# Altium footprint library others.PcbLib: 50 footprints (part 3 of 4)
Each footprint in its own frame and in the unit in brackets; x right, y up, seen from the top. Pads: shape width x height; smd on the part's side, far side on the other; paste and mask are expansions set on the pad; w line width, h text height; cw(c..) or ccw(c..) is an arc to the next point about the centre after c.
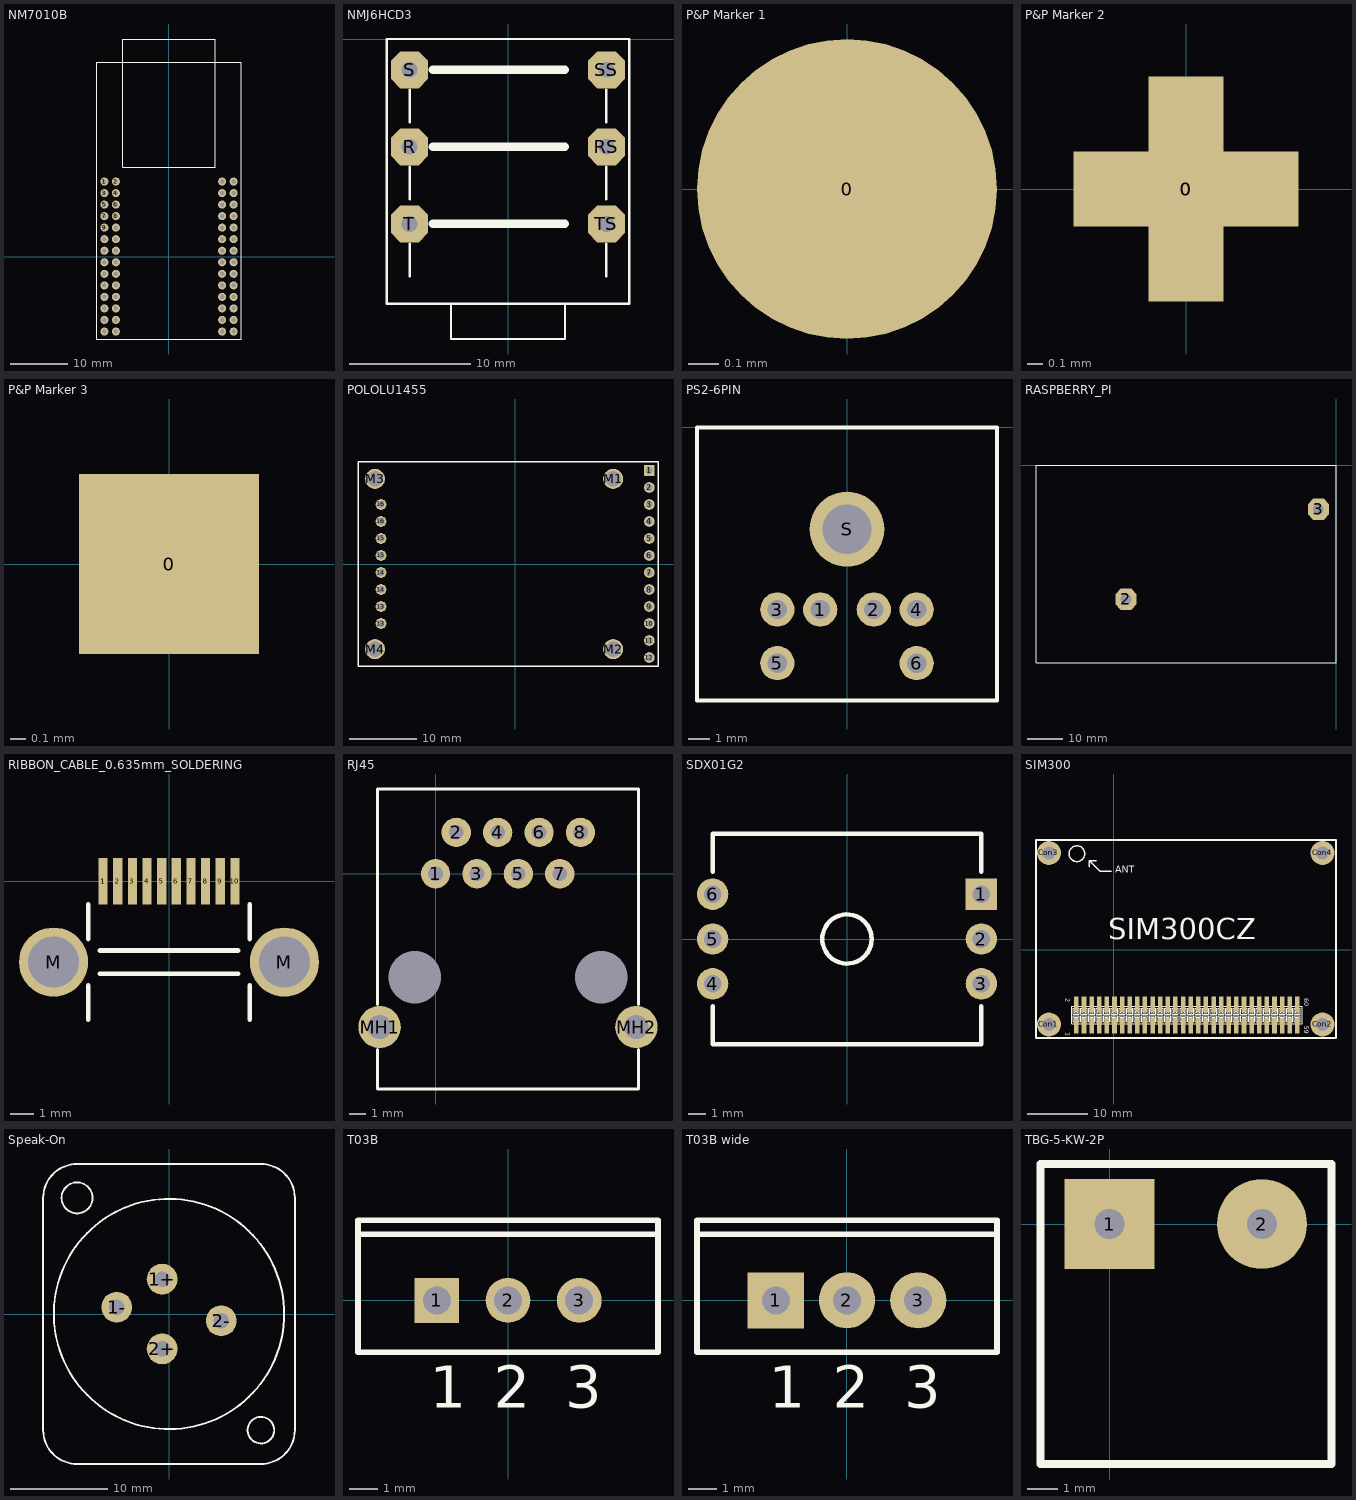
[diagram p2: the footprints below, top view; thin cyan lines are the x and y axes]

## NM7010B [mm]
pads (56):
  round 1.4 hole 0.8: 1(-11.2,13) 2(-9.2,13) 3(-11.2,11) 4(-9.2,11) 5(-11.2,9) 6(-9.2,9) 7(-11.2,7) 8(-9.2,7) 9(-11.2,5) 10(-9.2,5) 11(-11.2,3) 12(-9.2,3) 13(-11.2,1) 14(-9.2,1) 15(-11.2,-1) 16(-9.2,-1) 17(-11.2,-3) 18(-9.2,-3) 19(-11.2,-5) 20(-9.2,-5) 21(-11.2,-7) 22(-9.2,-7) 23(-11.2,-9) 24(-9.2,-9) 25(-11.2,-11) 26(-9.2,-11) 27(-11.2,-13) 28(-9.2,-13) 29(9.2,13) 30(11.2,13) 31(9.2,11) 32(11.2,11) 33(9.2,9) 34(11.2,9) 35(9.2,7) 36(11.2,7) 37(9.2,5) 38(11.2,5) 39(9.2,3) 40(11.2,3) 41(9.2,1) 42(11.2,1) 43(9.2,-1) 44(11.2,-1) 45(9.2,-3) 46(11.2,-3) 47(9.2,-5) 48(11.2,-5) 49(9.2,-7) 50(11.2,-7) 51(9.2,-9) 52(11.2,-9) 53(9.2,-11) 54(11.2,-11) 55(9.2,-13) 56(11.2,-13)
Top Overlay:
  lines w0.2: -12.5,-14.3 -12.5,33.7 12.5,33.7 12.5,-14.3 -12.5,-14.3 ; -8,15.5 8,15.5 8,37.7 -8,37.7 -8,15.5

## NMJ6HCD3 [mm]
pads (6):
  oct 3.048x3.048 hole 1.3: R(-8.115,-8.89) RS(8.115,-8.89) S(-8.115,-2.54) SS(8.115,-2.54) T(-8.115,-15.24) TS(8.115,-15.24)
Top Overlay:
  lines w0.2: -8.115,-19.558 -8.115,-16.891 ; -8.115,-13.208 -8.115,-10.541 ; -8.115,-6.858 -8.115,-4.191 ; -4.7,-21.81 -4.7,-24.73 4.7,-24.73 4.7,-21.81 ; 8.115,-19.558 8.115,-16.891 ; 8.115,-13.208 8.115,-10.541 ; 8.115,-6.858 8.115,-4.191 ; -10,-21.81 10,-21.81 10,0 -10,0 -10,-21.81
  lines w0.7: -6.223,-15.24 4.699,-15.24 ; -6.223,-8.89 4.699,-8.89 ; -6.223,-2.54 4.699,-2.54

## P&P Marker 1 [mm] "SMD Pick&Place Machine Marker"
pads (1):
  round 1 smd paste-1 mask+0.508: 0(0,0)

## P&P Marker 2 [mm] "SMD Pick&Place Machine Marker"
pads (2):
  rect 0.5x1.5 smd paste-1 mask+0.1: 0(0,0)
  rect 1.5x0.5 smd paste-1 mask+0.1: 0(0,0)
Top Solder:
  rectangle: -1,-1 1,1

## P&P Marker 3 [mm] "SMD Pick&Place Machine Marker"
pads (1):
  rect 1.2x1.2 smd paste-1 mask+0.1: 0(0,0)
Top Solder:
  rectangle: -1,-1 1,1

## POLOLU1455 [mm] "Pololu 18v25 CS High-Power Motor Driver"
pads (24):
  rect 1.6x1.6 hole 1: 1(20,13.97)
  round 1.6 hole 1: 2(20,11.43) 3(20,8.89) 4(20,6.35) 5(20,3.81) 6(20,1.27) 7(20,-1.27) 8(20,-3.81) 9(20,-6.35) 10(20,-8.89) 11(20,-11.43) 12(20,-13.97) 13(-20.066,-8.89) 13(-20.066,-6.35) 14(-20.066,-3.81) 14(-20.066,-1.27) 15(-20.066,1.27) 15(-20.066,3.81) 16(-20.066,6.35) 16(-20.066,8.89)
  round 3 hole 2.3: M1(14.605,12.7) M2(14.605,-12.7) M3(-20.955,12.7) M4(-20.955,-12.7)
Top Overlay:
  lines w0.2: -23.495,-15.24 21.3,-15.24 21.3,15.24 -23.495,15.24 -23.495,-15.24
3D body: height -12.5, standoff -13.05, extent -23.495,-15.25 21.3,15.23
3D body "Samtec-TSW-112-23-F-S.STEP": height 13.97, standoff 2.67, extent 18.73,-15.25 21.27,15.23
3D body "Samtec-SSW-108-01-G-S.step": height 8.51, standoff -2.64, extent -21.272,-10.541 -18.859,10.287
3D body "Samtec-TSW-108-23-F-S.STEP": height 13.97, standoff 2.67, extent -21.336,-10.287 -18.796,10.033
3D body: height 12.7, standoff 11.05, extent -23.495,-15.24 21.3,15.24
3D body "screwcl_m2x16.stp": height 14, standoff -3.3, extent -22.955,-14.7 -18.955,-10.7
3D body "screwcl_m2x16.stp": height 14, standoff -3.3, extent -22.955,10.7 -18.955,14.7
3D body "screwcl_m2x16.stp": height 14, standoff -3.3, extent 12.605,10.7 16.605,14.7
3D body "screwcl_m2x16.stp": height 14, standoff -3.3, extent 12.605,-14.7 16.605,-10.7
3D body "User Library-Capacitor electrolytic axial 1in pitch.STEP": height 13.5, standoff 2.49, extent 6.287,-13.174 14.287,13.123
3D body "User Library-Capacitor electrolytic axial 1in pitch.STEP": height 13.5, standoff 2.49, extent -3.238,-13.208 4.762,13.089
3D body "Samtec-SSW-112-01-G-S.step": height 8.51, standoff -2.64, extent 18.793,-15.524 21.207,15.464

## PS2-6PIN [mm]
pads (7):
  round 1.6 hole 0.9: 1(-1.25,-8.5) 2(1.25,-8.5) 3(-3.25,-8.5) 4(3.25,-8.5) 5(-3.25,-11) 6(3.25,-11)
  round 3.5 hole 2.3: S(0,-4.75)
Top Overlay:
  lines w0.2: -7,-12.75 7,-12.75 7,0 -7,0 -7,-12.75

## RASPBERRY_PI [mm]
pads (2):
  oct 6x6 hole 3: 2(-59.5,-38) 3(-5,-12.5)
Top Overlay:
  lines w0.2: -85,-56 -85,0 0,0 0,-56 -85,-56
3D body "User Library-R-pi.STEP": height 36.73, standoff 15.83, extent -95.55,-57.1 8.55,7.5

## RIBBON_CABLE_0.635mm_SOLDERING [mm]
pads (13):
  rect 0.4x2 smd: 1(-2.857,0) 1(-2.857,0) 2(-2.222,0) 3(-1.587,0) 4(-0.953,0) 5(-0.318,0) 6(0.318,0) 7(0.953,0) 8(1.587,0) 9(2.222,0) 10(2.857,0)
  round 3 hole 2.2: M(-5,-3.5) M(5,-3.5)
Top Overlay:
  lines w0.2: -3.5,-6 -3.5,-4.5 ; -3.5,-2.5 -3.5,-1 ; -3,-4 3,-4 ; -3,-3 3,-3 ; 3.5,-6 3.5,-4.5 ; 3.5,-2.5 3.5,-1

## RJ45 [mm]
height 12.7
pads (12):
  round 1.8 hole 0.9: 1(0,0) 2(1.27,2.54) 3(2.54,0) 4(3.81,2.54) 5(5.08,0) 6(6.35,2.54) 7(7.62,0) 8(8.89,2.54)
  round 2.6 hole 1.5: MH1(-3.429,-9.398) MH2(12.319,-9.398)
  round 0 hole 3.2: MH3(-1.27,-6.35) MH4(10.16,-6.35)
Top Overlay:
  lines w0.2: -3.555,-10.8 -3.555,-13.2 12.445,-13.2 12.445,-10.8 ; -3.555,-8 -3.555,5.2 12.445,5.2 12.445,-8

## SDX01G2 [mil]
pads (6):
  rect 70x70 hole 39.37: 1(300,100)
  round 70 hole 39.37: 2(300,0) 3(300,-100) 4(-300,-100) 5(-300,0) 6(-300,100)
Top Overlay:
  circle w10: c0,0 r55
  lines w10: -300,-150 -300,-235 300,-235 300,-150 ; -300,150 -300,235 300,235 300,150

## SIM300 [mm]
height 1.092
pads (64):
  rect 0.76x2.54 smd: 1(-6.223,-12.66) 2(-6.223,-9.1) 3(-4.953,-12.66) 4(-4.953,-9.1) 5(-3.683,-12.66) 6(-3.683,-9.1) 7(-2.413,-12.66) 8(-2.413,-9.1) 9(-1.143,-12.66) 10(-1.143,-9.1) 11(0.127,-12.66) 12(0.127,-9.1) 13(1.397,-12.66) 14(1.397,-9.1) 15(2.667,-12.66) 16(2.667,-9.1) 17(3.937,-12.66) 18(3.937,-9.1) 19(5.207,-12.66) 20(5.207,-9.1) 21(6.477,-12.66) 22(6.477,-9.1) 23(7.747,-12.66) 24(7.747,-9.1) 25(9.017,-12.66) 26(9.017,-9.1) 27(10.287,-12.66) 28(10.287,-9.1) 29(11.557,-12.66) 30(11.557,-9.1) 31(12.827,-12.66) 32(12.827,-9.1) 33(14.097,-12.66) 34(14.097,-9.1) 35(15.367,-12.66) 36(15.367,-9.1) 37(16.637,-12.66) 38(16.637,-9.1) 39(17.907,-12.66) 40(17.907,-9.1) 41(19.177,-12.66) 42(19.177,-9.1) 43(20.447,-12.66) 44(20.447,-9.1) 45(21.717,-12.66) 46(21.717,-9.1) 47(22.987,-12.66) 48(22.987,-9.1) 49(24.257,-12.66) 50(24.257,-9.1) 51(25.527,-12.66) 52(25.527,-9.1) 53(26.797,-12.66) 54(26.797,-9.1) 55(28.067,-12.66) 56(28.067,-9.1) 57(29.337,-12.66) 58(29.337,-9.1) 59(30.607,-12.66) 60(30.607,-9.1)
  round 4 hole 2.2: Con1(-10.795,-12.446) Con2(34.798,-12.446) Con3(-10.795,16.129) Con4(34.798,16.129)
Top Overlay:
  drawing of 493 lines, arcs and shapes, not listed
  text "ANT" at 0.254,12.827 h1.14
  text "SIM300CZ" at -0.889,1.778 h3.56
  text "2" at -8.001,-8.128 h0.76
  text "1" at -8.001,-13.716 h0.76
  text "59" at 31.75,-12.7 h0.76
  text "60" at 31.75,-8.128 h0.76

## Speak-On [mm]
height 24
pads (4):
  round 3.2 hole 1.6: 1+(-0.7,3.6) 1-(-5.4,0.7) 2+(-0.7,-3.6) 2-(5.4,-0.7)
Top Overlay:
  circle w0.2: c0,0 r11.9
  circle w0.2: c-9.5,12 r1.6
  circle w0.2: c9.5,-12 r1.374
  lines w0.2: -13,-12 ccw(c-9.5,-12) -9.5,-15.5 9.5,-15.5 ccw(c9.5,-12) 13,-12 13,12 ccw(c9.5,12) 9.5,15.5 -9.5,15.5 ccw(c-9.5,12) -13,12 -13,-12

## T03B [mm] "TO, Thru-Hole, Vertical, Heatsink Mounted; 3 In-Line Leads; Pitch 2.54 mm"
height 19.4
pads (3):
  rect 1.6x1.6 hole 1: 1(-2.54,0)
  round 1.6 hole 1: 2(0,0) 3(2.54,0)
Top Overlay:
  lines w0.2: -5.35,2.35 5.35,2.35 ; -5.35,-1.85 5.35,-1.85 5.35,2.85 -5.35,2.85 -5.35,-1.85
  text "2" at -0.5,-3.825 h1.5
  text "1" at -2.79,-3.825 h1.5
  text "3" at 2.04,-3.825 h1.5

## T03B wide [mm]
pads (3):
  rect 2x2 hole 1: 1(-2.54,0)
  round 2 hole 1: 2(0,0) 3(2.54,0)
Top Overlay:
  lines w0.2: -5.35,2.35 5.35,2.35 ; -5.35,-1.85 5.35,-1.85 5.35,2.85 -5.35,2.85 -5.35,-1.85
  text "2" at -0.5,-3.825 h1.5
  text "1" at -2.79,-3.825 h1.5
  text "3" at 2.04,-3.825 h1.5

## TBG-5-KW-2P [mm]
pads (2):
  rect 3x3 hole 1: 1(0,0)
  round 3 hole 1: 2(5.08,0)
Top Overlay:
  lines w0.254: -2.3,-8 -2.3,2 7.4,2 7.4,-8 -2.3,-8